# Altium footprint library 项目.PcbLib: 34 footprints (part 1 of 3)
Each footprint in its own frame and in the unit in brackets; x right, y up, seen from the top. Pads: shape width x height; smd on the part's side, far side on the other; paste and mask are expansions set on the pad; w line width, h text height; cw(c..) or ccw(c..) is an arc to the next point about the centre after c.
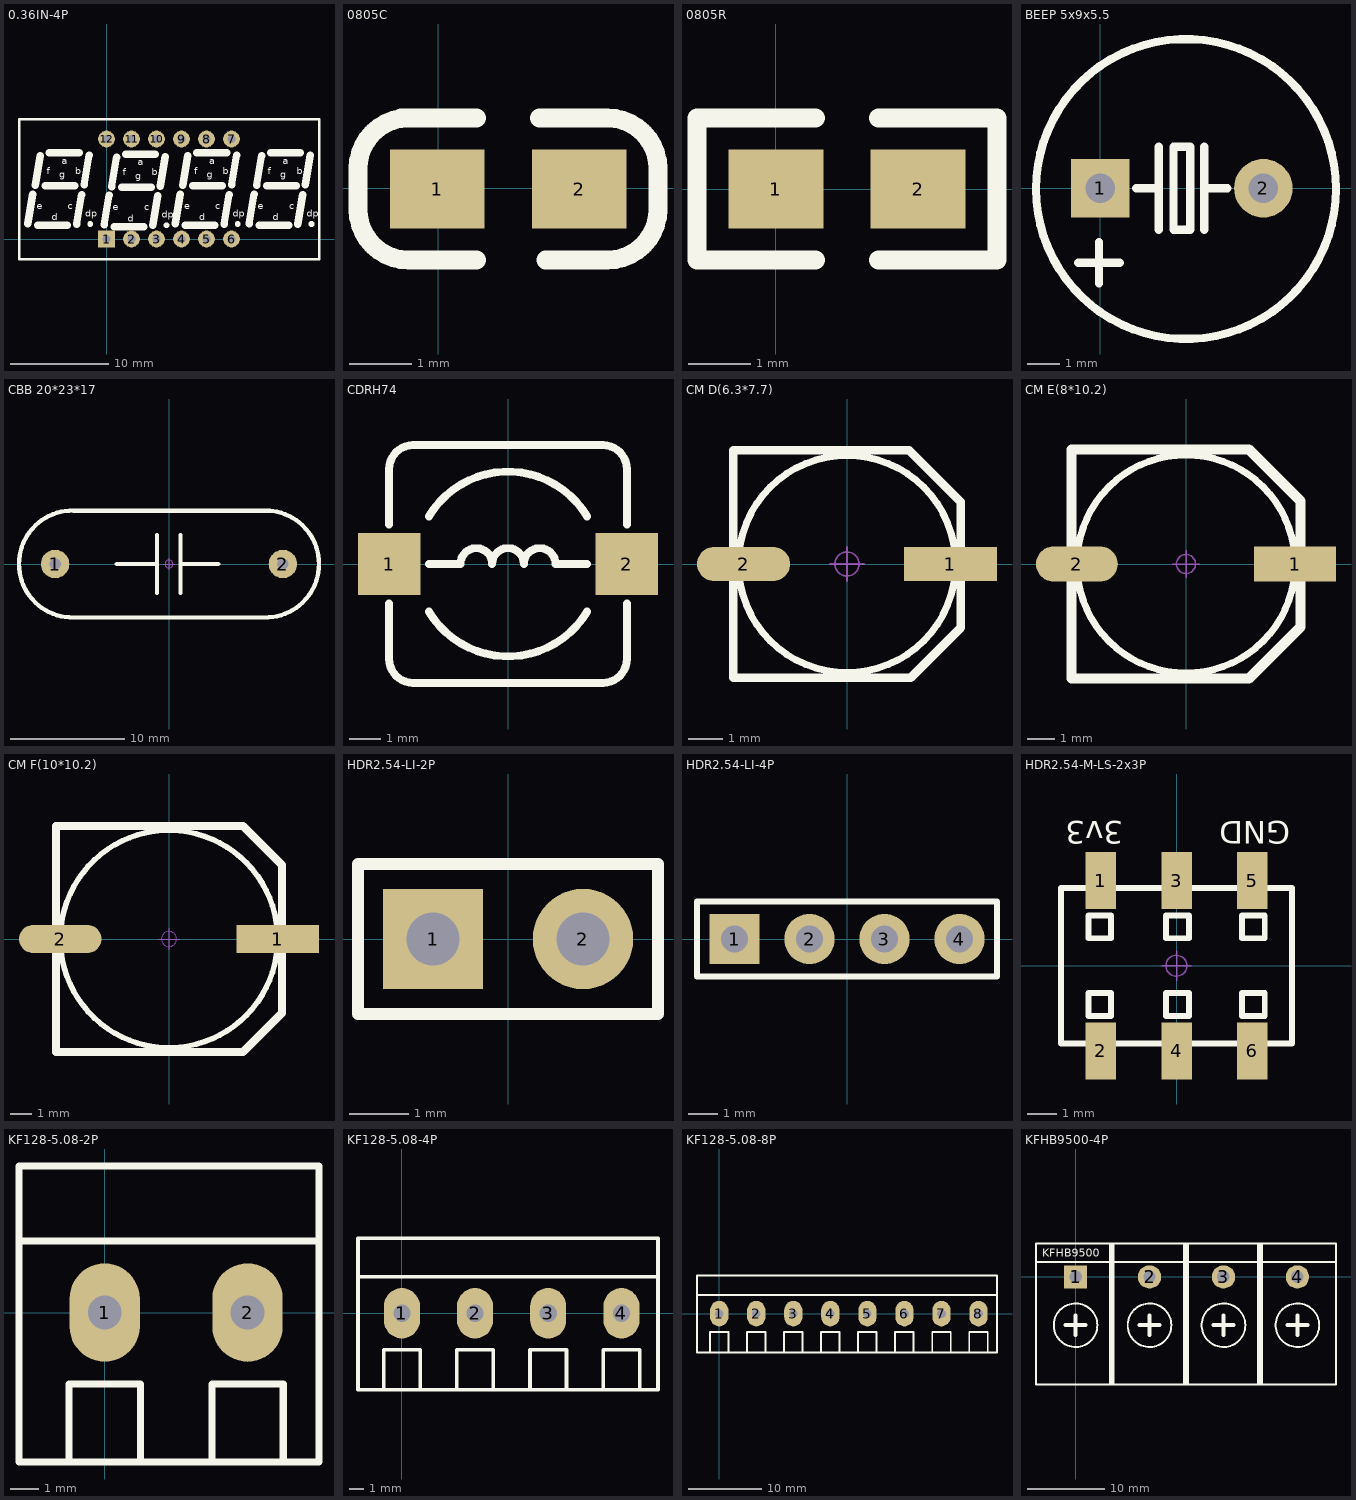
[diagram p0: the footprints below, top view; thin cyan lines are the x and y axes]

## 0.36IN-4P [mm]
pads (12):
  rect 1.7x1.7 hole 0.8: 1(0,0)
  round 1.7 hole 0.8: 2(2.54,0) 3(5.08,0) 4(7.62,0) 5(10.16,0) 6(12.7,0) 7(12.7,10.16) 8(10.16,10.16) 9(7.62,10.16) 10(5.08,10.16) 11(2.54,10.16) 12(0,10.16)
Top Overlay:
  circle w0.5: c20.828,1.524 r0.05
  circle w0.5: c13.335,1.524 r0.05
  circle w0.5: c6.096,1.397 r0.05
  circle w0.5: c-1.651,1.524 r0.05
  lines w0.254: -8.89,-2.032 -8.89,12.192 21.59,12.192 21.59,-2.032 -8.89,-2.032
  lines w0.762: -8.001,1.575 -7.493,4.572 ; -7.239,5.461 -6.731,8.458 ; -6.985,1.397 -3.985,1.397 ; -6.223,5.41 -3.223,5.41 ; -5.794,8.763 -2.794,8.763 ; -3.048,1.524 -2.54,4.521 ; -2.286,5.512 -1.778,8.509 ; -0.254,1.448 0.254,4.445 ; 0.508,5.334 1.016,8.331 ; 0.762,1.27 3.762,1.27 ; 1.524,5.283 4.524,5.283 ; 1.953,8.636 4.953,8.636 ; 4.699,1.397 5.207,4.394 ; 5.461,5.385 5.969,8.382 ; 6.985,1.575 7.493,4.572 ; 7.747,5.461 8.255,8.458 ; 8.001,1.397 11.001,1.397 ; 8.763,5.41 11.763,5.41 ; 9.192,8.763 12.192,8.763 ; 11.938,1.524 12.446,4.521 ; 12.7,5.512 13.208,8.509 ; 14.478,1.575 14.986,4.572 ; 15.24,5.461 15.748,8.458 ; 15.494,1.397 18.494,1.397 ; 16.256,5.41 19.256,5.41 ; 16.685,8.763 19.685,8.763 ; 19.431,1.524 19.939,4.521 ; 20.193,5.512 20.701,8.509
  text "f" at 16.383,6.604 h0.7
  text "b" at 19.304,6.604 h0.7
  text "g" at 17.653,6.223 h0.7
  text "a" at 17.907,7.62 h0.7
  text "d" at 16.891,1.905 h0.7
  text "e" at 15.367,3.048 h0.7
  text "dp" at 20.32,2.286 h0.7
  text "c" at 18.542,3.048 h0.7
  text "c" at 11.049,3.048 h0.7
  text "dp" at 12.827,2.286 h0.7
  text "e" at 7.874,3.048 h0.7
  text "d" at 9.398,1.905 h0.7
  text "a" at 10.414,7.62 h0.7
  text "g" at 10.16,6.223 h0.7
  text "b" at 11.811,6.604 h0.7
  text "f" at 8.89,6.604 h0.7
  text "c" at 3.81,2.921 h0.7
  text "dp" at 5.588,2.159 h0.7
  text "e" at 0.635,2.921 h0.7
  text "d" at 2.159,1.778 h0.7
  text "a" at 3.175,7.493 h0.7
  text "g" at 2.921,6.096 h0.7
  text "b" at 4.572,6.477 h0.7
  text "f" at 1.651,6.477 h0.7
  text "c" at -3.937,3.048 h0.7
  text "dp" at -2.159,2.286 h0.7
  text "e" at -7.112,3.048 h0.7
  text "d" at -5.588,1.905 h0.7
  text "a" at -4.572,7.62 h0.7
  text "g" at -4.826,6.223 h0.7
  text "b" at -3.175,6.604 h0.7
  text "f" at -6.096,6.604 h0.7
3D body "0.36IN-4P.STEP": height 7.2, standoff -3.6, extent -8.65,-1.935 21.35,12.065

## 0805C [mil]
pads (2):
  rect 60x50 smd: 1(-0.71,-0.4) 2(89.29,-0.4)
Top Overlay:
  lines w12: -50.85,-13.26 ccw(c-18.71,-13.26) -18.71,-45.4 24.29,-45.4 ; -50.85,-12.26 -50.85,12.6 cw(c-18.71,12.6) -18.71,44.74 ; -23.71,44.6 24.29,44.6 ; 64.29,44.6 107.29,44.6 ; 68.15,-45.4 107.15,-45.4 ccw(c107.15,-13.26) 139.29,-13.26 139.29,11.6 ; 107.15,44.74 cw(c107.15,12.6) 139.29,12.6
3D body "0805 SMD Capacitor.STEP": height 30.79, standoff 0, extent 5.63,-24.6 84.37,24.61

## 0805R [mil]
pads (2):
  rect 60x50 smd: 1(0,0) 2(90,0)
Top Overlay:
  lines w12: 25,-45 -50,-45 -50,45 25,45 ; 65,-45 140,-45 140,45 65,45
3D body "RES0805.STEP": height 15, standoff -1.14, extent 1.26,-24.6 80,24.61

## BEEP 5x9x5.5 [mm]
pads (2):
  rect 1.8x1.8 hole 0.9: 1(0,0)
  round 1.8 hole 0.9: 2(5,0)
Top Overlay:
  circle w0.254: c2.627,-0.023 r4.6
  lines w0.254: -0.675,-2.286 0.595,-2.286 ; -0.04,-2.921 -0.04,-1.651 ; 1.103,0 1.791,0 ; 1.791,-1.27 1.791,1.27 ; 3.185,-1.27 3.185,1.27 ; 3.312,0 3.897,0 ; 2.246,-1.27 2.754,-1.27 2.754,1.27 2.246,1.27 2.246,-1.27
3D body "BEEP 5x9x5.5.STEP": height 5.45, standoff -3.55, extent -1.96,-4.445 7.04,4.555

## CBB 20*23*17 [mm]
pads (2):
  round 2.5 hole 1: 1(-10,0) 2(10,0)
Top Overlay:
  lines w0.381: -8.382,4.682 8.89,4.682 ; -8.382,4.691 ccw(c-8.476,0) -8.382,-4.691 8.382,-4.691 ccw(c8.476,0) 8.382,4.691 ; -4.572,0 -1.277,0 ; -1.054,-2.54 -1.054,2.54 ; 1.016,-2.54 1.016,2.54 ; 1.016,0 4.318,0
Mechanical 15:
  circle w0.05: c0,0 r0.35
  lines w0.05: -0.5,0 0.5,0 ; 0,-0.5 0,0.5
3D body "CBB 20X23X17.STEP": height 17.53, standoff -3.47, extent -11.5,-4.5 11.5,4.5

## CDRH74 [mm]
pads (2):
  rect 2x2 smd: 1(-3.81,0) 2(3.81,0)
Top Overlay:
  lines w0.254: -3.81,-1.27 -3.81,-3.048 ccw(c-3.048,-3.048) -3.048,-3.81 3.048,-3.81 ccw(c3.048,-3.048) 3.81,-3.048 3.81,-1.27 ; -3.81,1.27 -3.81,3.048 cw(c-3.048,3.048) -3.048,3.81 3.048,3.81 cw(c3.048,3.048) 3.81,3.048 3.81,1.27 ; -2.54,-1.524 ccw(c0,0) 2.54,-1.524 ; -2.54,0 -1.524,0 cw(c-1.016,0) -0.508,0 cw(c0,0) 0.508,0 cw(c1.016,0) 1.524,0 2.54,0 ; -2.54,1.524 cw(c0,0) 2.54,1.524
3D body "CDRH74.STEP": height 4.5, standoff 0, extent -3.65,-3.617 3.65,3.683

## CM D(6.3*7.7) [mm]
pads (2):
  rect 2.7x1 smd: 1(3,0)
  oval 2.7x1 smd: 2(-3,0)
Top Overlay:
  circle w0.2: c0,0 r3.15
  lines w0.254: -3.3,-3.3 1.85,-3.3 3.3,-1.85 3.3,1.8 1.8,3.3 -3.3,3.3 -3.3,-3.3
Mechanical 15:
  circle w0.05: c0,0 r0.35
  lines w0.05: -0.5,0 0.5,0 ; 0,-0.5 0,0.5
3D body "CM D(6.3X7.7).STEP": height 7.7, standoff -0.01, extent -3.5,-3.3 3.5,3.3

## CM E(8*10.2) [mm]
pads (2):
  rect 3x1.3 smd: 1(4,0)
  oval 3x1.3 smd: 2(-4,0)
Top Overlay:
  circle w0.254: c0,0 r4
  lines w0.381: -4.2,-4.2 2.3,-4.2 4.2,-2.3 4.2,2.3 2.3,4.2 -4.2,4.2 -4.2,-4.2
Mechanical 15:
  circle w0.05: c0,0 r0.35
  lines w0.05: -0.5,0 0.5,0 ; 0,-0.5 0,0.5
3D body "CM E(8X10.2).STEP": height 10.2, standoff -0.01, extent -4.5,-4.15 4.5,4.15

## CM F(10*10.2) [mm]
pads (2):
  rect 3.8x1.3 smd: 1(5,0)
  oval 3.8x1.3 smd: 2(-5,0)
Top Overlay:
  circle w0.254: c0,0 r5
  lines w0.381: 5.191,-3.413 3.404,-5.2 -5.2,-5.2 -5.2,5.2 3.404,5.2 5.2,3.404 5.2,-3.404
Mechanical 15:
  circle w0.05: c0,0 r0.35
  lines w0.05: -0.5,0 0.5,0 ; 0,-0.5 0,0.5
3D body "CM F(10X10.2).STEP": height 10.2, standoff -0.01, extent -5.8,-5.15 5.8,5.15

## HDR2.54-LI-2P [mm]
pads (2):
  rect 1.7x1.7 hole 0.9: 1(-1.27,0)
  round 1.7 hole 0.9: 2(1.27,0)
Top Overlay:
  lines w0.2: -2.54,-1.27 2.54,-1.27 2.54,1.27 -2.54,1.27 -2.54,-1.27
3D body "HDR2.54-1P.STEP": height 8.5, standoff -3, extent -2.54,-1.27 0,1.27
3D body "HDR2.54-1P.STEP": height 8.5, standoff -3, extent 0,-1.27 2.54,1.27

## HDR2.54-LI-4P [mm]
pads (4):
  rect 1.7x1.7 hole 0.9: 1(-3.81,0)
  round 1.7 hole 0.9: 2(-1.27,0) 3(1.27,0) 4(3.81,0)
Top Overlay:
  lines w0.2: -5.08,-1.27 5.08,-1.27 5.08,1.27 -5.08,1.27 -5.08,-1.27
3D body "HDR2.54-1P.STEP": height 8.5, standoff -3, extent 2.54,-1.27 5.08,1.27
3D body "HDR2.54-1P.STEP": height 8.5, standoff -3, extent 0,-1.27 2.54,1.27
3D body "HDR2.54-1P.STEP": height 8.5, standoff -3, extent -2.54,-1.27 0,1.27
3D body "HDR2.54-1P.STEP": height 8.5, standoff -3, extent -5.08,-1.27 -2.54,1.27

## HDR2.54-M-LS-2x3P [mm]
pads (6):
  rect 1.02x1.9 smd: 1(-2.54,2.85) 2(-2.54,-2.85) 3(0,2.85) 4(0,-2.85) 5(2.54,2.85) 6(2.54,-2.85)
Top Overlay:
  lines w0.2: -3.87,-2.6 -3.87,2.6 3.87,2.6 3.87,-2.6 -3.87,-2.6 ; -2.951,-1.681 -2.951,-0.919 -2.189,-0.919 -2.189,-1.681 -2.951,-1.681 ; -2.951,0.919 -2.951,1.681 -2.189,1.681 -2.189,0.919 -2.951,0.919 ; -0.351,-1.681 -0.351,-0.919 0.411,-0.919 0.411,-1.681 -0.351,-1.681 ; -0.351,0.919 -0.351,1.681 0.411,1.681 0.411,0.919 -0.351,0.919 ; 2.189,-1.681 2.951,-1.681 2.951,-0.919 2.189,-0.919 2.189,-1.681 ; 2.189,0.919 2.951,0.919 2.951,1.681 2.189,1.681 2.189,0.919
  text "GND" at 3.81,4.826 h0.76
  text "3v3" at -1.778,4.826 h0.76
Mechanical 15:
  circle w0.05: c0,0 r0.35
  lines w0.05: -0.5,0 0.5,0 ; 0,-0.5 0,0.5
3D body "HDR2.54 2x1P_M.STEP": height 5.15, standoff 0, extent 1.24,-3.2 3.84,3.2
3D body "HDR2.54 2x1P_M.STEP": height 5.15, standoff 0, extent -1.3,-3.2 1.3,3.2
3D body "HDR2.54 2x1P_M.STEP": height 5.15, standoff 0, extent -3.84,-3.2 -1.24,3.2

## KF128-5.08-2P [mm]
pads (2):
  oval 2.5x3.5 hole 1.2: 1(0,0) 2(5.08,0)
Top Overlay:
  lines w0.254: -3.048,2.54 7.62,2.54 ; -1.27,-5.309 -1.27,-2.54 1.27,-2.54 1.27,-5.309 ; 3.81,-5.309 3.81,-2.54 6.35,-2.54 6.35,-5.309 ; -3.048,-5.309 7.62,-5.309 7.62,5.207 -3.048,5.207 -3.048,-5.309
3D body "KF128-5.08-.STEP": height 14.15, standoff -3.95, extent 2.032,-5.377 7.612,5.123
3D body "KF128-5.08-.STEP": height 14.15, standoff -3.95, extent -3.048,-5.377 2.532,5.123

## KF128-5.08-4P [mm]
pads (4):
  oval 2.5x3.5 hole 1.2: 1(0,0) 2(5.08,0) 3(10.16,0) 4(15.24,0)
Top Overlay:
  lines w0.254: -3.048,2.54 17.78,2.54 ; -1.27,-5.309 -1.27,-2.54 1.27,-2.54 1.27,-5.309 ; 3.81,-5.309 3.81,-2.54 6.35,-2.54 6.35,-5.309 ; 8.89,-5.309 8.89,-2.54 11.43,-2.54 11.43,-5.309 ; 13.97,-5.309 13.97,-2.54 16.51,-2.54 16.51,-5.309 ; -3.048,-5.309 -3.048,5.207 17.78,5.207 17.78,-5.309 -3.048,-5.309
3D body "KF128-5.08-.STEP": height 14.15, standoff -3.95, extent 12.192,-5.377 17.772,5.123
3D body "KF128-5.08-.STEP": height 14.15, standoff -3.95, extent 7.112,-5.377 12.692,5.123
3D body "KF128-5.08-.STEP": height 14.15, standoff -3.95, extent 2.032,-5.377 7.612,5.123
3D body "KF128-5.08-.STEP": height 14.15, standoff -3.95, extent -3.048,-5.377 2.532,5.123

## KF128-5.08-8P [mm]
pads (8):
  oval 2.5x3.5 hole 1.2: 1(0,0) 2(5.08,0) 3(10.16,0) 4(15.24,0) 5(20.32,0) 6(25.4,0) 7(30.48,0) 8(35.56,0)
Top Overlay:
  lines w0.254: -3.048,2.54 38.1,2.54 ; -1.27,-5.309 -1.27,-2.54 1.27,-2.54 1.27,-5.309 ; 3.81,-5.309 3.81,-2.54 6.35,-2.54 6.35,-5.309 ; 8.89,-5.309 8.89,-2.54 11.43,-2.54 11.43,-5.309 ; 13.97,-5.309 13.97,-2.54 16.51,-2.54 16.51,-5.309 ; 19.05,-5.309 19.05,-2.54 21.59,-2.54 21.59,-5.309 ; 24.13,-5.309 24.13,-2.54 26.67,-2.54 26.67,-5.309 ; 29.21,-5.309 29.21,-2.54 31.75,-2.54 31.75,-5.309 ; 34.29,-5.309 34.29,-2.54 36.83,-2.54 36.83,-5.309 ; -3.048,-5.309 -3.048,5.207 38.1,5.207 38.1,-5.309 -3.048,-5.309
3D body "KF128-5.08-.STEP": height 14.15, standoff -3.95, extent 27.432,-5.377 33.012,5.123
3D body "KF128-5.08-.STEP": height 14.15, standoff -3.95, extent 32.512,-5.377 38.092,5.123
3D body "KF128-5.08-.STEP": height 14.15, standoff -3.95, extent 12.192,-5.377 17.772,5.123
3D body "KF128-5.08-.STEP": height 14.15, standoff -3.95, extent 17.272,-5.377 22.852,5.123
3D body "KF128-5.08-.STEP": height 14.15, standoff -3.95, extent 22.352,-5.377 27.932,5.123
3D body "KF128-5.08-.STEP": height 14.15, standoff -3.95, extent 7.112,-5.377 12.692,5.123
3D body "KF128-5.08-.STEP": height 14.15, standoff -3.95, extent 2.032,-5.377 7.612,5.123
3D body "KF128-5.08-.STEP": height 14.15, standoff -3.95, extent -3.048,-5.377 2.532,5.123

## KFHB9500-4P [mm]
pads (4):
  rect 3x3 hole 1.6: 1(0,0)
  round 3 hole 1.6: 2(9.5,0) 3(19,0) 4(28.5,0)
Top Overlay:
  circle w0.254: c28.5,-6.2 r2.8
  circle w0.254: c0,-6.2 r2.8
  circle w0.254: c9.5,-6.2 r2.8
  circle w0.254: c19,-6.2 r2.8
  lines w0.254: -5.08,1.928 4.826,1.928 ; 4.42,1.928 14.326,1.928 ; 4.674,-13.82 4.674,4.3 ; 13.92,1.928 23.826,1.928 ; 14.174,-13.82 14.174,4.3 ; 14.353,-13.82 14.353,4.3 ; 23.42,1.928 33.326,1.928 ; 23.674,-13.82 23.674,4.3 ; 23.853,-13.82 23.853,4.3 ; 23.953,-13.82 23.953,4.3 ; 23.953,-13.82 23.953,4.3 ; 23.953,-13.82 13.92,-13.82 13.92,4.3 23.953,4.3 ; -5.08,-13.82 -5.08,4.3 4.853,4.3 4.853,-13.82 -5.08,-13.82 ; 4.42,-13.82 4.42,4.3 14.453,4.3 14.453,-13.82 4.42,-13.82 ; 23.42,-13.82 23.42,4.3 33.453,4.3 33.453,-13.82 23.42,-13.82
  lines w0.508: -1.27,-6.2 1.27,-6.2 ; 0,-7.47 0,-4.93 ; 8.23,-6.2 10.77,-6.2 ; 9.5,-7.47 9.5,-4.93 ; 17.73,-6.2 20.27,-6.2 ; 19,-7.47 19,-4.93 ; 27.23,-6.2 29.77,-6.2 ; 28.5,-7.47 28.5,-4.93
  text "KFHB9500" at -4.267,2.563 h1.02
3D body "KFHB9500.STEP": height 14.05, standoff -3.25, extent 13.793,-13.699 23.793,4.301
3D body "KFHB9500.STEP": height 14.05, standoff -3.25, extent -5.207,-13.699 4.793,4.301
3D body "KFHB9500.STEP": height 14.05, standoff -3.25, extent 4.293,-13.699 14.293,4.301
3D body "KFHB9500.STEP": height 14.05, standoff -3.25, extent 23.293,-13.699 33.293,4.301